# Altium footprint library Troposphere_lib.PcbLib: 48 footprints (part 3 of 3)
Each footprint in its own frame and in the unit in brackets; x right, y up, seen from the top. Pads: shape width x height; smd on the part's side, far side on the other; paste and mask are expansions set on the pad; w line width, h text height; cw(c..) or ccw(c..) is an arc to the next point about the centre after c.
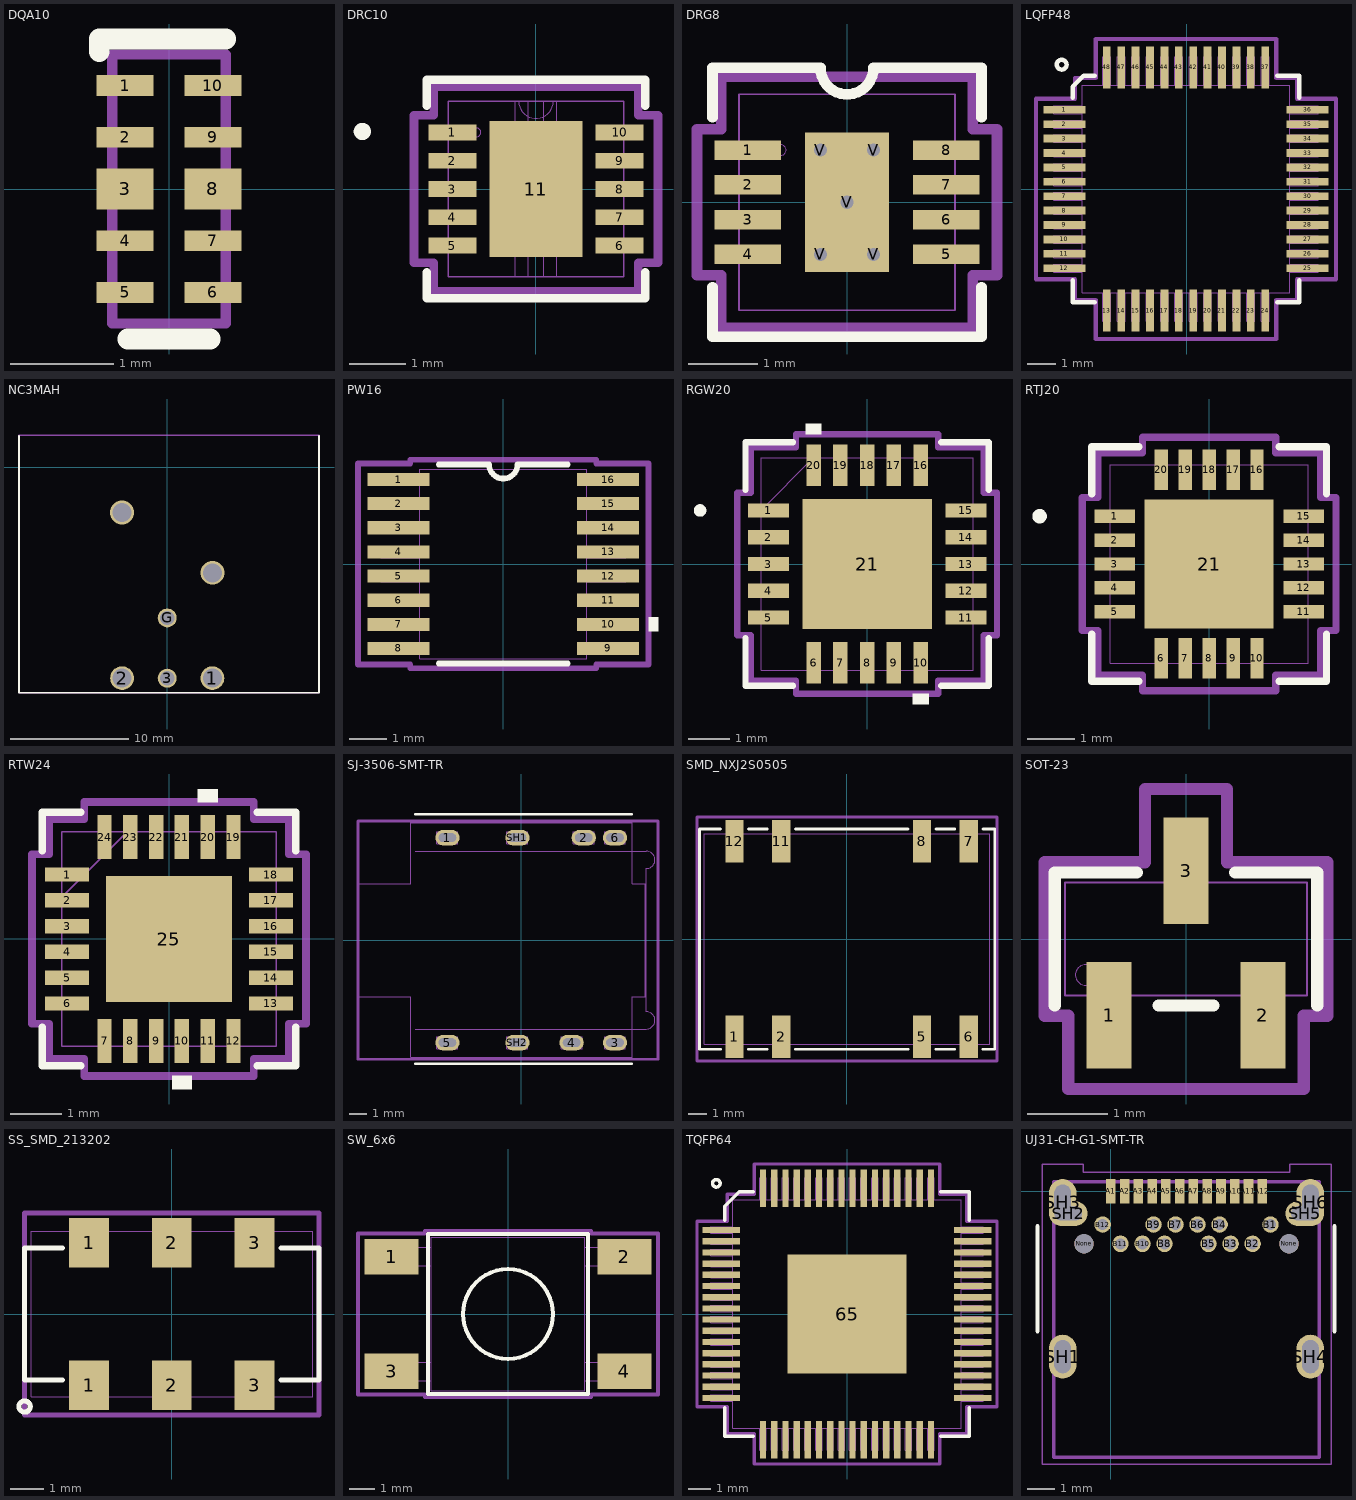
[diagram p2: the footprints below, top view; thin cyan lines are the x and y axes]

## DQA10 [mm]
pads (10):
  rect 0.55x0.2 smd paste+0 mask+0.051: 1(-0.425,1) 2(-0.425,0.5) 4(-0.425,-0.5) 5(-0.425,-1) 6(0.425,-1) 7(0.425,-0.5) 9(0.425,0.5) 10(0.425,1)
  rect 0.55x0.4 smd paste+0 mask+0.051: 3(-0.425,0) 8(0.425,0)
Top Overlay:
  lines w0.2: -0.675,1.33 -0.675,1.45 -0.55,1.45 0.55,1.45 ; -0.4,-1.45 0.4,-1.45
Mechanical 13:
  lines w0.1: -0.55,-1.3 0.55,-1.3 0.55,1.3 -0.55,1.3 -0.55,-1.3
3D body "DQA0010A.stp": height 0.55, standoff 0, extent -0.5,-1.25 0.5,1.25

## DRC10 [mm]
pads (11):
  rect 0.85x0.28 smd paste-0.14 mask+0: 1(-1.475,1) 2(-1.475,0.5) 3(-1.475,0) 4(-1.475,-0.5) 5(-1.475,-1) 6(1.475,-1) 7(1.475,-0.5) 8(1.475,0) 9(1.475,0.5) 10(1.475,1)
  rect 1.65x2.4 smd paste-0.825 mask+0: 11(0,0)
Top Overlay:
  circle w0.152: c-3.066,1.016 r0.076
  lines w0.152: -1.931,-1.471 -1.931,-1.931 1.931,-1.931 1.931,-1.471 ; -1.931,1.471 -1.931,1.931 1.931,1.931 1.931,1.471
Top Paste:
  region: 0.312,-1.251 0.184,-1.251 0.184,-1.499 0.312,-1.499
  region: -0.312,-1.251 -0.184,-1.251 -0.184,-1.499 -0.312,-1.499
  region: -0.312,1.251 -0.184,1.251 -0.184,1.499 -0.312,1.499
  region: 0.312,1.251 0.184,1.251 0.184,1.499 0.312,1.499
  region: 0.825,1.2 -0.825,1.2 -0.825,-1.2 0.825,-1.2
  region: 1.865,1.105 1.085,1.105 1.085,0.895 1.865,0.895
  region: 1.865,0.605 1.085,0.605 1.085,0.395 1.865,0.395
  region: 1.865,0.105 1.085,0.105 1.085,-0.105 1.865,-0.105
  region: 1.865,-0.395 1.085,-0.395 1.085,-0.605 1.865,-0.605
  region: 1.865,-0.895 1.085,-0.895 1.085,-1.105 1.865,-1.105
  region: -1.085,-0.895 -1.865,-0.895 -1.865,-1.105 -1.085,-1.105
  region: -1.085,-0.395 -1.865,-0.395 -1.865,-0.605 -1.085,-0.605
  region: -1.085,0.105 -1.865,0.105 -1.865,-0.105 -1.085,-0.105
  region: -1.085,0.605 -1.865,0.605 -1.865,0.395 -1.085,0.395
  region: -1.085,1.105 -1.865,1.105 -1.865,0.895 -1.085,0.895
Top Solder:
  region: 0.363,-1.2 0.133,-1.2 0.133,-1.55 0.363,-1.55
  region: -0.363,-1.2 -0.133,-1.2 -0.133,-1.55 -0.363,-1.55
  region: -0.363,1.2 -0.133,1.2 -0.133,1.55 -0.363,1.55
  region: 0.363,1.2 0.133,1.2 0.133,1.55 0.363,1.55
  region: 0,-1.2
  region: 0,1.2
  region: 1.935,1.175 1.015,1.175 1.015,0.825 1.935,0.825
  region: 1.935,0.675 1.015,0.675 1.015,0.325 1.935,0.325
  region: 1.935,0.175 1.015,0.175 1.015,-0.175 1.935,-0.175
  region: 1.935,-0.325 1.015,-0.325 1.015,-0.675 1.935,-0.675
  region: 1.935,-0.825 1.015,-0.825 1.015,-1.175 1.935,-1.175
  region: -1.015,-0.825 -1.935,-0.825 -1.935,-1.175 -1.015,-1.175
  region: -1.015,-0.325 -1.935,-0.325 -1.935,-0.675 -1.015,-0.675
  region: -1.015,0.175 -1.935,0.175 -1.935,-0.175 -1.015,-0.175
  region: -1.015,0.675 -1.935,0.675 -1.935,0.325 -1.015,0.325
  region: -1.015,1.175 -1.935,1.175 -1.935,0.825 -1.015,0.825
Mechanical 13:
  circle w0: c-1.05,1 r0.076
  region: 0,-1.2
  region: 0,1.2
  lines w0: -0.363,-1.2 -0.363,-1.55 -0.133,-1.55 -0.133,-1.2 ; -0.363,1.2 -0.363,1.55 -0.133,1.55 -0.133,1.2 ; -0.305,1.55 ccw(c0,1.55) 0.305,1.55 ; 0.133,-1.2 0.133,-1.55 0.363,-1.55 0.363,-1.2 ; 0.133,1.2 0.133,1.55 0.363,1.55 0.363,1.2
  lines w0.025: -1.55,-1.55 -1.55,1.55 1.55,1.55 1.55,-1.55 -1.55,-1.55
Mechanical 15:
  lines w0.152: -2.154,-1.301 -1.804,-1.301 -1.804,-1.804 1.804,-1.804 1.804,-1.301 2.154,-1.301 2.154,1.301 1.804,1.301 1.804,1.804 -1.804,1.804 -1.804,1.301 -2.154,1.301 -2.154,-1.301
3D body "DRC10_2P4X1P65.stp": height 1, standoff 0, extent -1.55,-1.55 1.55,1.55

## DRG8 [mm]
pads (14):
  rect 0.95x0.28 smd paste-0.14 mask+0: 1(-1.425,0.75) 2(-1.425,0.25) 3(-1.425,-0.25) 4(-1.425,-0.75) 5(1.425,-0.75) 6(1.425,-0.25) 7(1.425,0.25) 8(1.425,0.75)
  round 0.3 hole 0.188: V(-0.381,-0.75) V(-0.381,0.75) V(0,0) V(0.381,-0.75) V(0.381,0.75)
  rect 1.2x2 smd paste-0.987 mask-0.991: ""(0,0)
Top Layer:
  region: 0,-1
  region: 0,1
Top Overlay:
  lines w0.152: -1.931,-1.221 -1.931,-1.931 1.931,-1.931 1.931,-1.221 ; -1.931,1.221 -1.931,1.931 -0.381,1.931 ccw(c0,1.931) 0.381,1.931 1.931,1.931 1.931,1.221
Top Paste:
  region: 0.525,-0.494 0.241,-0.494 0.1,-0.635 0.1,-0.925 0.525,-0.925
  region: 0.525,0.294 0.241,0.294 0.1,0.152 0.1,-0.152 0.241,-0.294 0.525,-0.294
  region: 0.525,0.925 0.1,0.925 0.1,0.635 0.241,0.494 0.525,0.494
  region: -0.241,-0.494 -0.525,-0.494 -0.525,-0.925 -0.1,-0.925 -0.1,-0.635
  region: -0.241,0.294 -0.525,0.294 -0.525,-0.294 -0.241,-0.294 -0.1,-0.152 -0.1,0.152
  region: -0.1,0.925 -0.525,0.925 -0.525,0.494 -0.241,0.494 -0.1,0.635
  region: 1.875,0.865 0.975,0.865 0.975,0.635 1.875,0.635
  region: 1.875,0.365 0.975,0.365 0.975,0.135 1.875,0.135
  region: 1.875,-0.135 0.975,-0.135 0.975,-0.365 1.875,-0.365
  region: 1.875,-0.635 0.975,-0.635 0.975,-0.865 1.875,-0.865
  region: -0.975,-0.635 -1.875,-0.635 -1.875,-0.865 -0.975,-0.865
  region: -0.975,-0.135 -1.875,-0.135 -1.875,-0.365 -0.975,-0.365
  region: -0.975,0.365 -1.875,0.365 -1.875,0.135 -0.975,0.135
  region: -0.975,0.865 -1.875,0.865 -1.875,0.635 -0.975,0.635
Top Solder:
  region: 0,-1
  region: 0,1
  region: 0.2,-1.064 0.2,1.064 0.663,1.064 0.663,-1.064
  region: -0.663,-1.064 -0.663,1.064 -0.2,1.064 -0.2,-1.064
  region: -0.663,-1.064 -0.663,-0.594 0.663,-0.594 0.663,-1.064
  region: -0.663,-0.194 -0.663,0.194 0.663,0.194 0.663,-0.194
  region: -0.663,0.594 -0.663,1.064 0.663,1.064 0.663,0.594
  region: 1.97,0.96 0.88,0.96 0.88,0.54 1.97,0.54
  region: 1.97,0.46 0.88,0.46 0.88,0.04 1.97,0.04
  region: 1.97,-0.04 0.88,-0.04 0.88,-0.46 1.97,-0.46
  region: 1.97,-0.54 0.88,-0.54 0.88,-0.96 1.97,-0.96
  region: -0.88,-0.54 -1.97,-0.54 -1.97,-0.96 -0.88,-0.96
  region: -0.88,-0.04 -1.97,-0.04 -1.97,-0.46 -0.88,-0.46
  region: -0.88,0.46 -1.97,0.46 -1.97,0.04 -0.88,0.04
  region: -0.88,0.96 -1.97,0.96 -1.97,0.54 -0.88,0.54
Mechanical 13:
  circle w0: c-0.95,0.75 r0.076
  lines w0.025: -1.55,-1.55 -1.55,1.55 1.55,1.55 1.55,-1.55 -1.55,-1.55
Mechanical 15:
  lines w0.152: -2.154,-1.051 -1.804,-1.051 -1.804,-1.804 1.804,-1.804 1.804,-1.051 2.154,-1.051 2.154,1.051 1.804,1.051 1.804,1.804 -1.804,1.804 -1.804,1.051 -2.154,1.051 -2.154,-1.051
3D body "DRG8_1P2X2P0.stp": height 0.8, standoff 0, extent -1.55,-1.55 1.55,1.55

## LQFP48 [mm]
pads (48):
  rect 1.461x0.27 smd paste+0 mask+0: 1(-4.25,2.753) 2(-4.25,2.253) 3(-4.25,1.753) 4(-4.25,1.253) 5(-4.25,0.753) 6(-4.25,0.253) 7(-4.25,-0.247) 8(-4.25,-0.747) 9(-4.25,-1.247) 10(-4.25,-1.747) 11(-4.25,-2.247) 12(-4.25,-2.747) 25(4.2,-2.747) 26(4.2,-2.247) 27(4.2,-1.747) 28(4.2,-1.247) 29(4.2,-0.747) 30(4.2,-0.247) 31(4.2,0.253) 32(4.2,0.753) 33(4.2,1.253) 34(4.2,1.753) 35(4.2,2.253) 36(4.2,2.753)
  rect 0.27x1.461 smd paste+0 mask+0: 13(-2.775,-4.222) 14(-2.275,-4.222) 15(-1.775,-4.222) 16(-1.275,-4.222) 17(-0.775,-4.222) 18(-0.275,-4.222) 19(0.225,-4.222) 20(0.725,-4.222) 21(1.225,-4.222) 22(1.725,-4.222) 23(2.225,-4.222) 24(2.725,-4.222) 37(2.725,4.228) 38(2.225,4.228) 39(1.725,4.228) 40(1.225,4.228) 41(0.725,4.228) 42(0.225,4.228) 43(-0.275,4.228) 44(-0.775,4.228) 45(-1.275,4.228) 46(-1.775,4.228) 47(-2.275,4.228) 48(-2.775,4.228)
Top Overlay:
  circle w0.152: c-4.343,4.321 r0.17
  lines w0.152: -3.962,-3.172 -3.962,-3.934 -3.2,-3.934 ; -3.962,3.178 -3.962,3.559 -3.581,3.94 -3.2,3.94 ; 3.15,-3.934 3.912,-3.934 3.912,-3.172 ; 3.15,3.94 3.912,3.94 3.912,3.178
Mechanical 13:
  drawing of 196 lines, arcs and shapes, not listed
Mechanical 15:
  lines w0.152: -5.234,-3.136 -3.879,-3.136 -3.879,-3.851 -3.164,-3.851 -3.164,-5.207 3.114,-5.207 3.114,-3.851 3.829,-3.851 3.829,-3.136 5.185,-3.136 5.185,3.142 3.829,3.142 3.829,3.857 3.114,3.857 3.114,5.213 -3.164,5.213 -3.164,3.857 -3.879,3.857 -3.879,3.142 -5.234,3.142 -5.234,-3.136
3D body "LQFP-48.stp": height 1.6, standoff 0, extent -4.597,-4.597 4.597,4.597

## NC3MAH [mm]
pads (4):
  round 2 hole 1.6: 1(3.81,-17.78) 2(-3.81,-17.78)
  round 1.6 hole 1.2: 3(0,-17.78) G(0,-12.7)
via 3.81,-8.89 diameter 2 hole 1.6
via -3.81,-3.81 diameter 2 hole 1.6
Top Overlay:
  lines w0.152: -12.498,2.667 -12.498,-19 12.8,-19 12.8,2.667
Mechanical 13:
  circle w0.013: c-3.81,-3.81 r0.8
  circle w0.013: c0,-12.7 r0.6
  circle w0.013: c-3.81,-17.78 r0.8
  circle w0.013: c3.81,-8.89 r0.8
  circle w0.013: c0,-17.78 r0.6
  circle w0.013: c3.81,-17.78 r0.8
  lines w0.025: -12.498,-19 -12.498,2.7 12.8,2.7 12.8,-19 -12.498,-19
Mechanical 15:
  lines w0.152: -12.498,-19 -12.498,2.7 12.8,2.7 12.8,-19 -12.498,-19
3D body "Neutrik NC3MAH-0.STEP": height 25.3, standoff -3.5, extent -12.498,-19 12.8,2.7

## PW16 [mil]
pads (16):
  rect 66x14 smd paste+0 mask+0: 1(-111,89.57) 2(-111,63.98) 3(-111,38.39) 4(-111,12.8) 5(-111,-12.8) 6(-111,-38.39) 7(-111,-63.98) 8(-111,-89.57) 9(111,-89.57) 10(111,-63.98) 11(111,-38.39) 12(111,-12.8) 13(111,12.8) 14(111,38.39) 15(111,63.98) 16(111,89.57)
Top Overlay:
  region: 154,-56.48 164,-56.48 164,-71.48 154,-71.48
  lines w6: -68.42,-105.5 68.42,-105.5 ; -68.42,105.5 -15,105.5 ccw(c0,105.5) 15,105.5 68.42,105.5
Mechanical 13:
  lines w0: -12,100.5 ccw(c0,100.5) 12,100.5
  lines w1: -130,-95.57 -130,-83.57 -88.5,-83.57 -88.5,-95.57 -130,-95.57 ; -130,-69.98 -130,-57.98 -88.5,-57.98 -88.5,-69.98 -130,-69.98 ; -130,-44.39 -130,-32.39 -88.5,-32.39 -88.5,-44.39 -130,-44.39 ; -130,-18.8 -130,-6.8 -88.5,-6.8 -88.5,-18.8 -130,-18.8 ; -130,6.8 -130,18.8 -88.5,18.8 -88.5,6.8 -130,6.8 ; -130,32.39 -130,44.39 -88.5,44.39 -88.5,32.39 -130,32.39 ; -130,57.98 -130,69.98 -88.5,69.98 -88.5,57.98 -130,57.98 ; -130,83.57 -130,95.57 -88.5,95.57 -88.5,83.57 -130,83.57 ; -88.5,-100.5 88.5,-100.5 88.5,100.5 -88.5,100.5 -88.5,-100.5 ; 88.5,-95.57 88.5,-83.57 130,-83.57 130,-95.57 88.5,-95.57 ; 88.5,-69.98 88.5,-57.98 130,-57.98 130,-69.98 88.5,-69.98 ; 88.5,-44.39 88.5,-32.39 130,-32.39 130,-44.39 88.5,-44.39 ; 88.5,-18.8 88.5,-6.8 130,-6.8 130,-18.8 88.5,-18.8 ; 88.5,6.8 88.5,18.8 130,18.8 130,6.8 88.5,6.8 ; 88.5,32.39 88.5,44.39 130,44.39 130,32.39 88.5,32.39 ; 88.5,57.98 88.5,69.98 130,69.98 130,57.98 88.5,57.98 ; 88.5,83.57 88.5,95.57 130,95.57 130,83.57 88.5,83.57
Mechanical 15:
  lines w6: -154,-106.57 -154,106.57 -98.5,106.57 -98.5,110.5 98.5,110.5 98.5,106.57 154,106.57 154,-106.57 98.5,-106.57 98.5,-110.5 -98.5,-110.5 -98.5,-106.57 -154,-106.57
3D body "PW16.stp": height 47.09, standoff 0, extent -129.99,-100.5 130.01,100.52

## RGW20 [mm]
pads (21):
  rect 1x0.35 smd paste-0.175 mask+0: 1(-2.4,1.3) 2(-2.4,0.65) 3(-2.4,0) 4(-2.4,-0.65) 5(-2.4,-1.3) 11(2.4,-1.3) 12(2.4,-0.65) 13(2.4,0) 14(2.4,0.65) 15(2.4,1.3)
  rect 0.35x1 smd paste-0.175 mask+0: 6(-1.3,-2.4) 7(-0.65,-2.4) 8(0,-2.4) 9(0.65,-2.4) 10(1.3,-2.4) 16(1.3,2.4) 17(0.65,2.4) 18(0,2.4) 19(-0.65,2.4) 20(-1.3,2.4)
  rect 3.15x3.15 smd paste-1.562 mask-1.562: 21(0,0)
Top Overlay:
  circle w0.152: c-4.056,1.3 r0.076
  region: -1.109,3.154 -1.49,3.154 -1.49,3.408 -1.109,3.408
  region: 1.49,-3.154 1.109,-3.154 1.109,-3.408 1.49,-3.408
  lines w0.152: -2.956,-1.803 -2.956,-2.956 -1.803,-2.956 ; -2.956,1.803 -2.956,2.956 -1.803,2.956 ; 1.803,-2.956 2.956,-2.956 2.956,-1.803 ; 1.803,2.956 2.956,2.956 2.956,1.803
Top Paste:
  drawing of 45 lines, arcs and shapes, not listed
Top Solder:
  region: 1.381,-1.639 1.381,1.639 1.639,1.639 1.639,-1.639
  region: 0.981,-1.639 0.981,1.639 0.594,1.639 0.594,-1.639
  region: 0.194,-1.639 0.194,1.639 -0.194,1.639 -0.194,-1.639
  region: -0.594,-1.639 -0.594,1.639 -0.981,1.639 -0.981,-1.639
  region: -1.639,-1.639 -1.639,1.639 -1.381,1.639 -1.381,-1.639
  region: -1.639,-1.639 -1.639,-1.381 1.639,-1.381 1.639,-1.639
  region: -1.639,-0.981 -1.639,-0.594 1.639,-0.594 1.639,-0.981
  region: -1.639,-0.194 -1.639,0.194 1.639,0.194 1.639,-0.194
  region: -1.639,0.594 -1.639,0.981 1.639,0.981 1.639,0.594
  region: -1.639,1.381 -1.639,1.639 1.639,1.639 1.639,1.381
  region: -1.055,2.97 -1.545,2.97 -1.545,1.83 -1.055,1.83
  region: -0.405,2.97 -0.895,2.97 -0.895,1.83 -0.405,1.83
  region: 0.245,2.97 -0.245,2.97 -0.245,1.83 0.245,1.83
  region: 0.895,2.97 0.405,2.97 0.405,1.83 0.895,1.83
  region: 1.545,2.97 1.055,2.97 1.055,1.83 1.545,1.83
  region: 2.97,1.545 1.83,1.545 1.83,1.055 2.97,1.055
  region: 2.97,0.895 1.83,0.895 1.83,0.405 2.97,0.405
  region: 2.97,0.245 1.83,0.245 1.83,-0.245 2.97,-0.245
  region: 2.97,-0.405 1.83,-0.405 1.83,-0.895 2.97,-0.895
  region: 2.97,-1.055 1.83,-1.055 1.83,-1.545 2.97,-1.545
  region: 1.545,-1.83 1.055,-1.83 1.055,-2.97 1.545,-2.97
  region: 0.895,-1.83 0.405,-1.83 0.405,-2.97 0.895,-2.97
  region: 0.245,-1.83 -0.245,-1.83 -0.245,-2.97 0.245,-2.97
  region: -0.405,-1.83 -0.895,-1.83 -0.895,-2.97 -0.405,-2.97
  region: -1.055,-1.83 -1.545,-1.83 -1.545,-2.97 -1.055,-2.97
  region: -1.83,-1.055 -2.97,-1.055 -2.97,-1.545 -1.83,-1.545
  region: -1.83,-0.405 -2.97,-0.405 -2.97,-0.895 -1.83,-0.895
  region: -1.83,0.245 -2.97,0.245 -2.97,-0.245 -1.83,-0.245
  region: -1.83,0.895 -2.97,0.895 -2.97,0.405 -1.83,0.405
  region: -1.83,1.545 -2.97,1.545 -2.97,1.055 -1.83,1.055
Mechanical 13:
  lines w0.025: -2.575,1.305 -1.305,2.575 ; -2.575,-2.575 -2.575,2.575 2.575,2.575 2.575,-2.575 -2.575,-2.575
Mechanical 15:
  lines w0.152: -3.154,-1.729 -3.154,1.729 -2.829,1.729 -2.829,2.829 -1.729,2.829 -1.729,3.154 1.729,3.154 1.729,2.829 2.829,2.829 2.829,1.729 3.154,1.729 3.154,-1.729 2.829,-1.729 2.829,-2.829 1.729,-2.829 1.729,-3.154 -1.729,-3.154 -1.729,-2.829 -2.829,-2.829 -2.829,-1.729 -3.154,-1.729
3D body "RGW20_3P15X3P15.step": height 1, standoff 0, extent -2.626,-2.626 2.626,2.626

## RTJ20 [mm]
pads (21):
  rect 0.85x0.28 smd paste-0.14 mask+0: 1(-1.975,1) 2(-1.975,0.5) 3(-1.975,0) 4(-1.975,-0.5) 5(-1.975,-1) 11(1.975,-1) 12(1.975,-0.5) 13(1.975,0) 14(1.975,0.5) 15(1.975,1)
  rect 0.28x0.85 smd paste-0.14 mask+0: 6(-1,-1.975) 7(-0.5,-1.975) 8(0,-1.975) 9(0.5,-1.975) 10(1,-1.975) 16(1,1.975) 17(0.5,1.975) 18(0,1.975) 19(-0.5,1.975) 20(-1,1.975)
  rect 2.7x2.7 smd paste-1.337 mask-1.333: 21(0,0)
Top Overlay:
  circle w0.152: c-3.548,1 r0.076
  lines w0.152: -2.456,-1.468 -2.456,-2.456 -1.468,-2.456 ; -2.456,1.468 -2.456,2.456 -1.468,2.456 ; 1.468,-2.456 2.456,-2.456 2.456,-1.468 ; 1.468,2.456 2.456,2.456 2.456,1.468
Top Paste:
  drawing of 36 lines, arcs and shapes, not listed
Top Solder:
  region: 0.987,-1.413 0.987,1.413 1.413,1.413 1.413,-1.413
  region: 0.587,-1.413 0.587,1.413 0.2,1.413 0.2,-1.413
  region: -0.2,-1.413 -0.2,1.413 -0.587,1.413 -0.587,-1.413
  region: -1.413,-1.413 -1.413,1.413 -0.987,1.413 -0.987,-1.413
  region: -1.413,-1.413 -1.413,-0.987 1.413,-0.987 1.413,-1.413
  region: -1.413,-0.587 -1.413,-0.2 1.413,-0.2 1.413,-0.587
  region: -1.413,0.2 -1.413,0.587 1.413,0.587 1.413,0.2
  region: -1.413,0.987 -1.413,1.413 1.413,1.413 1.413,0.987
  region: -0.81,2.45 -1.19,2.45 -1.19,1.5 -0.81,1.5
  region: -0.31,2.45 -0.69,2.45 -0.69,1.5 -0.31,1.5
  region: 0.19,2.45 -0.19,2.45 -0.19,1.5 0.19,1.5
  region: 0.69,2.45 0.31,2.45 0.31,1.5 0.69,1.5
  region: 1.19,2.45 0.81,2.45 0.81,1.5 1.19,1.5
  region: 2.45,1.19 1.5,1.19 1.5,0.81 2.45,0.81
  region: 2.45,0.69 1.5,0.69 1.5,0.31 2.45,0.31
  region: 2.45,0.19 1.5,0.19 1.5,-0.19 2.45,-0.19
  region: 2.45,-0.31 1.5,-0.31 1.5,-0.69 2.45,-0.69
  region: 2.45,-0.81 1.5,-0.81 1.5,-1.19 2.45,-1.19
  region: 1.19,-1.5 0.81,-1.5 0.81,-2.45 1.19,-2.45
  region: 0.69,-1.5 0.31,-1.5 0.31,-2.45 0.69,-2.45
  region: 0.19,-1.5 -0.19,-1.5 -0.19,-2.45 0.19,-2.45
  region: -0.31,-1.5 -0.69,-1.5 -0.69,-2.45 -0.31,-2.45
  region: -0.81,-1.5 -1.19,-1.5 -1.19,-2.45 -0.81,-2.45
  region: -1.5,-0.81 -2.45,-0.81 -2.45,-1.19 -1.5,-1.19
  region: -1.5,-0.31 -2.45,-0.31 -2.45,-0.69 -1.5,-0.69
  region: -1.5,0.19 -2.45,0.19 -2.45,-0.19 -1.5,-0.19
  region: -1.5,0.69 -2.45,0.69 -2.45,0.31 -1.5,0.31
  region: -1.5,1.19 -2.45,1.19 -2.45,0.81 -1.5,0.81
Mechanical 13:
  lines w0.025: -2.075,-2.075 -2.075,2.075 2.075,2.075 2.075,-2.075 -2.075,-2.075
Mechanical 15:
  lines w0.152: -2.654,-1.394 -2.654,1.394 -2.329,1.394 -2.329,2.329 -1.394,2.329 -1.394,2.654 1.394,2.654 1.394,2.329 2.329,2.329 2.329,1.394 2.654,1.394 2.654,-1.394 2.329,-1.394 2.329,-2.329 1.394,-2.329 1.394,-2.654 -1.394,-2.654 -1.394,-2.329 -2.329,-2.329 -2.329,-1.394 -2.654,-1.394
Mechanical 16:
  circle w0.127: c0.787,0.787 r0.191
  circle w0.127: c0.787,0 r0.191
  circle w0.127: c0.787,-0.787 r0.191
  circle w0.127: c0,0.787 r0.191
  circle w0.127: c0,0 r0.191
  circle w0.127: c0,-0.787 r0.191
  circle w0.127: c-0.787,0.787 r0.191
  circle w0.127: c-0.787,0 r0.191
  circle w0.127: c-0.787,-0.787 r0.191
3D body "RTJ20_2P7X2P7.stp": height 0.8, standoff 0, extent -2.126,-2.126 2.126,2.126

## RTW24 [mm]
pads (25):
  rect 0.85x0.28 smd paste-0.14 mask+0: 1(-1.975,1.25) 2(-1.975,0.75) 3(-1.975,0.25) 4(-1.975,-0.25) 5(-1.975,-0.75) 6(-1.975,-1.25) 13(1.975,-1.25) 14(1.975,-0.75) 15(1.975,-0.25) 16(1.975,0.25) 17(1.975,0.75) 18(1.975,1.25)
  rect 0.28x0.85 smd paste-0.14 mask+0: 7(-1.25,-1.975) 8(-0.75,-1.975) 9(-0.25,-1.975) 10(0.25,-1.975) 11(0.75,-1.975) 12(1.25,-1.975) 19(1.25,1.975) 20(0.75,1.975) 21(0.25,1.975) 22(-0.25,1.975) 23(-0.75,1.975) 24(-1.25,1.975)
  rect 2.45x2.45 smd paste-1.212 mask-1.206: 25(0,0)
Top Overlay:
  region: 0.44,-2.654 0.059,-2.654 0.059,-2.908 0.44,-2.908
  region: 0.941,2.654 0.56,2.654 0.56,2.908 0.941,2.908
  lines w0.152: -2.456,-1.718 -2.456,-2.456 -1.718,-2.456 ; -2.456,1.718 -2.456,2.456 -1.718,2.456 ; 1.718,-2.456 2.456,-2.456 2.456,-1.718 ; 1.718,2.456 2.456,2.456 2.456,1.718
Top Paste:
  drawing of 40 lines, arcs and shapes, not listed
Top Solder:
  region: -1.48,1.46 -2.47,1.46 -2.47,1.04 -1.48,1.04
  region: -1.48,0.96 -2.47,0.96 -2.47,0.54 -1.48,0.54
  region: -1.48,0.46 -2.47,0.46 -2.47,0.04 -1.48,0.04
  region: -1.48,-0.04 -2.47,-0.04 -2.47,-0.46 -1.48,-0.46
  region: -1.48,-0.54 -2.47,-0.54 -2.47,-0.96 -1.48,-0.96
  region: -1.48,-1.04 -2.47,-1.04 -2.47,-1.46 -1.48,-1.46
  region: -1.04,-1.48 -1.46,-1.48 -1.46,-2.47 -1.04,-2.47
  region: -0.54,-1.48 -0.96,-1.48 -0.96,-2.47 -0.54,-2.47
  region: -0.04,-1.48 -0.46,-1.48 -0.46,-2.47 -0.04,-2.47
  region: 0.46,-1.48 0.04,-1.48 0.04,-2.47 0.46,-2.47
  region: 0.96,-1.48 0.54,-1.48 0.54,-2.47 0.96,-2.47
  region: 1.46,-1.48 1.04,-1.48 1.04,-2.47 1.46,-2.47
  region: 2.47,-1.04 1.48,-1.04 1.48,-1.46 2.47,-1.46
  region: 2.47,-0.54 1.48,-0.54 1.48,-0.96 2.47,-0.96
  region: 2.47,-0.04 1.48,-0.04 1.48,-0.46 2.47,-0.46
  region: 2.47,0.46 1.48,0.46 1.48,0.04 2.47,0.04
  region: 2.47,0.96 1.48,0.96 1.48,0.54 2.47,0.54
  region: 2.47,1.46 1.48,1.46 1.48,1.04 2.47,1.04
  region: 1.46,2.47 1.04,2.47 1.04,1.48 1.46,1.48
  region: 0.96,2.47 0.54,2.47 0.54,1.48 0.96,1.48
  region: 0.46,2.47 0.04,2.47 0.04,1.48 0.46,1.48
  region: -0.04,2.47 -0.46,2.47 -0.46,1.48 -0.04,1.48
  region: -0.54,2.47 -0.96,2.47 -0.96,1.48 -0.54,1.48
  region: -1.04,2.47 -1.46,2.47 -1.46,1.48 -1.04,1.48
  region: -1.289,0.987 -1.289,1.288 1.288,1.288 1.288,0.987
  region: -1.289,0.2 -1.289,0.587 1.288,0.587 1.288,0.2
  region: -1.289,-0.587 -1.289,-0.2 1.288,-0.2 1.288,-0.587
  region: -1.289,-1.289 -1.289,-0.987 1.288,-0.987 1.288,-1.289
  region: -1.289,-1.289 -1.289,1.288 -0.987,1.288 -0.987,-1.289
  region: -0.2,-1.289 -0.2,1.288 -0.587,1.288 -0.587,-1.289
  region: 0.587,-1.289 0.587,1.288 0.2,1.288 0.2,-1.289
  region: 0.987,-1.289 0.987,1.288 1.288,1.288 1.288,-1.289
Mechanical 13:
  lines w0.025: -2.075,0.805 -0.805,2.075 ; -2.075,-2.075 2.075,-2.075 2.075,2.075 -2.075,2.075 -2.075,-2.075
Mechanical 15:
  lines w0.152: -2.654,-1.644 -2.329,-1.644 -2.329,-2.329 -1.644,-2.329 -1.644,-2.654 1.644,-2.654 1.644,-2.329 2.329,-2.329 2.329,-1.644 2.654,-1.644 2.654,1.644 2.329,1.644 2.329,2.329 1.644,2.329 1.644,2.654 -1.644,2.654 -1.644,2.329 -2.329,2.329 -2.329,1.644 -2.654,1.644 -2.654,-1.644
Mechanical 16:
  circle w0.127: c-0.787,-0.787 r0.191
  circle w0.127: c-0.787,0 r0.191
  circle w0.127: c-0.787,0.787 r0.191
  circle w0.127: c0,-0.787 r0.191
  circle w0.127: c0,0 r0.191
  circle w0.127: c0,0.787 r0.191
  circle w0.127: c0.787,-0.787 r0.191
  circle w0.127: c0.787,0 r0.191
  circle w0.127: c0.787,0.787 r0.191
3D body "RTW24_2P45X2P45.stp": height 0.74, standoff 0, extent -2.126,-2.126 2.126,2.126

## SJ-3506-SMT-TR [mm]
pads (8):
  oval 1.4x0.9 hole 0.5 slot 1 at 0 deg: 1(-4.25,5.9) 2(3.6,5.9) 3(5.4,-5.9) 4(2.9,-5.9) 5(-4.25,-5.9) 6(5.4,5.9) SH1(-0.22,5.9) SH2(-0.22,-5.9)
Top Overlay:
  lines w0.152: -6.096,-7.112 6.35,-7.112 ; -6.096,7.239 6.35,7.239
Mechanical 13:
  lines w0.025: -6.1,-5.125 7.2,-5.125 ; -6.1,5.125 7.2,5.125 ; 7.196,-5.125 ccw(c7.187,-4.613) 7.7,-4.604 ccw(c7.213,-4.613) 7.204,-4.125 ; 7.196,5.125 cw(c7.187,4.613) 7.7,4.604 cw(c7.213,4.613) 7.204,4.125 ; 7.2,-4.125 7.2,4.125 ; -4.85,-6.25 -4.85,-5.55 -3.65,-5.55 -3.65,-6.25 -4.85,-6.25 ; -4.85,5.55 -4.85,6.25 -3.65,6.25 -3.65,5.55 -4.85,5.55 ; -0.82,-6.25 -0.82,-5.55 0.38,-5.55 0.38,-6.25 -0.82,-6.25 ; -0.82,5.55 -0.82,6.25 0.38,6.25 0.38,5.55 -0.82,5.55 ; 2.3,-6.25 2.3,-5.55 3.5,-5.55 3.5,-6.25 2.3,-6.25 ; 3,5.55 4.2,5.55 4.2,6.25 3,6.25 3,5.55 ; 4.8,-6.25 4.8,-5.55 6,-5.55 6,-6.25 4.8,-6.25 ; 4.8,5.55 4.8,6.25 6,6.25 6,5.55 4.8,5.55
  lines w0.05: -9.35,-3.25 -9.35,3.25 -6.35,3.25 -6.35,6.75 6.4,6.75 6.4,3.25 7.15,3.25 7.15,-3.25 6.4,-3.25 6.4,-6.75 -6.35,-6.75 -6.35,-3.25 -9.35,-3.25
Mechanical 15:
  lines w0.152: -9.398,-6.858 -6.35,-6.858 7.874,-6.858 7.874,6.858 -9.398,6.858 -9.398,-6.858
3D body "CUI_SJ-3506-SMT-TR.step": height 3.25, standoff -2.75, extent -8.8,-6.4 6.6,6.4

## SMD_NXJ2S0505 [mm]
pads (8):
  rect 1x2.3 smd mask+0: 1(-6.097,-5.3) 2(-3.557,-5.3) 5(4.063,-5.3) 6(6.603,-5.3) 7(6.603,5.3) 8(4.063,5.3) 11(-3.557,5.3) 12(-6.097,5.3)
Top Overlay:
  lines w0.152: -6.858,-5.969 -8.001,-5.969 -8.001,5.969 -6.858,5.969 ; -5.334,-5.969 -4.318,-5.969 ; -5.334,5.969 -4.318,5.969 ; -2.794,-5.969 3.302,-5.969 ; -2.794,5.969 3.302,5.969 ; 4.826,-5.969 5.842,-5.969 ; 4.826,5.969 5.842,5.969 ; 7.366,-5.969 8.001,-5.969 8.001,5.969 7.366,5.969
Mechanical 13:
  lines w0.025: -7.747,-5.715 -7.747,5.715 7.747,5.715 7.747,-5.715 -7.747,-5.715
Mechanical 15:
  lines w0.152: -8.128,-6.604 -6.604,-6.604 8.128,-6.604 8.128,6.604 -8.128,6.604 -8.128,-6.604
3D body "mps_dcdc_nxj2_5v_12v_mc_a.step": height 4.39, standoff -0.02, extent -7.747,-5.715 7.747,5.715

## SOT-23 [mil]
pads (3):
  rect 22x52 smd paste+0 mask+0: 1(-37.5,-37.21) 2(37.5,-37.21) 3(0,33.36)
Top Overlay:
  lines w6: -64,-32.5 -64,32.5 -24.1,32.5 ; -13.4,-32.5 13.4,-32.5 ; 24.1,32.5 64,32.5 64,-32.5
Mechanical 13:
  circle w0: c-49,-17.5 r5
  lines w1: -59,-27.5 59,-27.5 59,27.5 -59,27.5 -59,-27.5 ; -47.5,-49.21 -47.5,-27.5 -27.5,-27.5 -27.5,-49.21 -47.5,-49.21 ; -10,27.5 10,27.5 10,49.21 -10,49.21 -10,27.5 ; 27.5,-49.21 27.5,-27.5 47.5,-27.5 47.5,-49.21 27.5,-49.21
Mechanical 15:
  lines w6: -69,-37.5 -69,37.5 -20,37.5 -20,73.21 20,73.21 20,37.5 69,37.5 69,-37.5 57.5,-37.5 57.5,-73.21 -57.5,-73.21 -57.5,-37.5 -69,-37.5
3D body "SOT-23.stp": height 39.37, standoff 0, extent -59.05,-50 59.05,50.39

## SS_SMD_213202 [mm]
pads (6):
  rect 1.2x1.5 smd mask+0: 1(-2.5,-2.15) 1(-2.5,2.15) 2(0,-2.15) 2(0,2.15) 3(2.5,-2.15) 3(2.5,2.15)
Top Overlay:
  circle w0.152: c-4.445,-2.794 r0.17
  lines w0.152: -3.302,-2 -4.445,-2 -4.445,2 -3.302,2 ; 3.302,-2 4.445,-2 4.445,2 3.302,2
Mechanical 13:
  lines w0.025: -4.25,-2.496 4.25,-2.496 4.25,2.504 -4.25,2.504 -4.25,-2.496
Mechanical 15:
  lines w0.152: -4.445,-3.048 -2.921,-3.048 4.445,-3.048 4.445,3.048 -4.445,3.048 -4.445,-3.048
3D body "SSSS213202.STEP": height 5.8, standoff 0, extent -4.25,-2.496 4.25,2.504

## SW_6x6 [mil]
pads (4):
  rect 83x55 smd paste+0 mask+0: 1(-179,88) 2(179,88) 3(-179,-88) 4(179,-88)
Top Overlay:
  circle w6: c0,0 r69
  lines w6: -123,-123 123,-123 123,123 -123,123 -123,-123
Mechanical 13:
  circle w0: c0,0 r69
  lines w1: -197,-102.5 -197,-74.5 -118,-74.5 -118,-102.5 -197,-102.5 ; -197,74.5 -197,102.5 -118,102.5 -118,74.5 -197,74.5 ; -118,-118 118,-118 118,118 -118,118 -118,-118 ; 118,-102.5 118,-74.5 197,-74.5 197,-102.5 118,-102.5 ; 118,74.5 118,102.5 197,102.5 197,74.5 118,74.5
Mechanical 15:
  lines w6: -230.5,-123.5 -128,-123.5 -128,-128 128,-128 128,-123.5 230.5,-123.5 230.5,123.5 128,123.5 128,128 -128,128 -128,123.5 -230.5,123.5 -230.5,-123.5
3D body "Tactal Switch - SMD (6mmx 6mmx 4.3mm) - Marked.stp": height 169.29, standoff 0, extent -177.49,-118.74 177.51,118.76

## TQFP64 [mil]
pads (65):
  rect 65.5x11 smd paste+0 mask+0: 1(-221.25,147.64) 2(-221.25,127.95) 3(-221.25,108.27) 4(-221.25,88.58) 5(-221.25,68.9) 6(-221.25,49.21) 7(-221.25,29.53) 8(-221.25,9.84) 9(-221.25,-9.84) 10(-221.25,-29.53) 11(-221.25,-49.21) 12(-221.25,-68.9) 13(-221.25,-88.58) 14(-221.25,-108.27) 15(-221.25,-127.95) 16(-221.25,-147.64) 33(221.25,-147.64) 34(221.25,-127.95) 35(221.25,-108.27) 36(221.25,-88.58) 37(221.25,-68.9) 38(221.25,-49.21) 39(221.25,-29.53) 40(221.25,-9.84) 41(221.25,9.84) 42(221.25,29.53) 43(221.25,49.21) 44(221.25,68.9) 45(221.25,88.58) 46(221.25,108.27) 47(221.25,127.95) 48(221.25,147.64)
  rect 11x65.5 smd paste+0 mask+0: 17(-147.64,-221.25) 18(-127.95,-221.25) 19(-108.27,-221.25) 20(-88.58,-221.25) 21(-68.9,-221.25) 22(-49.21,-221.25) 23(-29.53,-221.25) 24(-9.84,-221.25) 25(9.84,-221.25) 26(29.53,-221.25) 27(49.21,-221.25) 28(68.9,-221.25) 29(88.58,-221.25) 30(108.27,-221.25) 31(127.95,-221.25) 32(147.64,-221.25) 49(147.64,221.25) 50(127.95,221.25) 51(108.27,221.25) 52(88.58,221.25) 53(68.9,221.25) 54(49.21,221.25) 55(29.53,221.25) 56(9.84,221.25) 57(-9.84,221.25) 58(-29.53,221.25) 59(-49.21,221.25) 60(-68.9,221.25) 61(-88.58,221.25) 62(-108.27,221.25) 63(-127.95,221.25) 64(-147.64,221.25)
  rect 208.66x208.66 smd mask+0: 65(0,0)
Top Overlay:
  circle w6: c-230,230 r6.69
  lines w6: -215,-165 -215,-215 -165,-215 ; -215,165 -215,190 -190,215 -165,215 ; 165,-215 215,-215 215,-165 ; 165,215 215,215 215,165
Mechanical 13:
  drawing of 260 lines, arcs and shapes, not listed
Mechanical 15:
  lines w6: -264,-163.14 -211,-163.14 -211,-211 -163.14,-211 -163.14,-264 163.14,-264 163.14,-211 211,-211 211,-163.14 264,-163.14 264,163.14 211,163.14 211,211 163.14,211 163.14,264 -163.14,264 -163.14,211 -211,211 -211,163.14 -264,163.14 -264,-163.14
3D body "TQFP64.stp": height 47.09, standoff 0, extent -239.99,-239.99 240.01,240.01

## UJ31-CH-G1-SMT-TR [mm]
pads (32):
  rect 0.35x0.89 smd: A1(0,0) A2(0.5,0) A3(1,0) A4(1.5,0) A5(2,0) A6(2.5,0) A7(3,0) A8(3.5,0) A9(4,0) A10(4.5,0) A11(5,0) A12(5.5,0)
  round 0.6 hole 0.4: B1(5.8,-1.205) B2(5.15,-1.905) B3(4.35,-1.905) B4(3.95,-1.205) B5(3.55,-1.905) B6(3.15,-1.205) B7(2.35,-1.205) B8(1.95,-1.905) B9(1.55,-1.205) B10(1.15,-1.905) B11(0.35,-1.905) B12(-0.3,-1.205)
  round 0.7 hole 0.7 unplated: None(-0.975,-1.905) None(6.475,-1.905)
  oval 1x1.6 hole 0.6 slot 1.2 at 90 deg: SH1(-1.75,-6.005) SH4(7.25,-6.005)
  oval 1.4x0.9 hole 0.5 slot 1 at 0 deg: SH2(-1.55,-0.805) SH5(7.05,-0.805)
  oval 1x1.7 hole 0.6 slot 1.3 at 90 deg: SH3(-1.75,-0.4) SH6(7.25,-0.4)
Top Overlay:
  lines w0.152: -2.667,-5.08 -2.667,-1.27 ; 8.128,-5.08 8.128,-1.27
Mechanical 4:
  lines w0: -2.05,-6.455 ccw(c-1.75,-6.455) -1.45,-6.455 ; -2.05,-5.555 cw(c-1.75,-5.555) -1.45,-5.555 ; -2.05,-0.804 ccw(c-1.775,-0.78) -1.751,-1.055 ; -2.05,-0.055 cw(c-1.75,-0.055) -1.45,-0.055 ; -1.3,-1.055 ccw(c-1.3,-0.805) -1.3,-0.555 ; 6.8,-1.055 cw(c6.8,-0.805) 6.8,-0.555 ; 6.95,-6.455 ccw(c7.25,-6.455) 7.55,-6.455 ; 6.95,-5.555 cw(c7.25,-5.555) 7.55,-5.555 ; 6.95,-0.055 cw(c7.25,-0.055) 7.55,-0.055 ; 7.251,-1.055 ccw(c7.275,-0.78) 7.55,-0.804
Mechanical 13:
  lines w0.127: -2.075,-9.655 7.575,-9.655 7.575,0.345 -2.075,0.345 -2.075,-9.655
Mechanical 15:
  lines w0: -2.05,-6.455 -2.05,-5.555 ; -2.05,-0.805 -2.05,-0.055 ; -1.75,-1.055 -1.3,-1.055 ; -1.45,-6.455 -1.45,-5.555 ; -1.45,-0.055 -1.45,-0.555 -1.3,-0.555 ; 6.8,-1.055 7.25,-1.055 ; 6.8,-0.555 6.95,-0.555 6.95,-0.055 ; 6.95,-6.455 6.95,-5.555 ; 7.55,-6.455 7.55,-5.555 ; 7.55,-0.805 7.55,-0.055
  lines w0.05: -2.5,-9.905 -2.5,0.995 -1,0.995 -1,0.695 6.5,0.695 6.5,0.995 8,0.995 8,-9.905 -2.5,-9.905
3D body "CUI_UJ31-CH-G1-SMT-TR.step": height 3.5, standoff -0.96, extent -2.2,-9.65 7.7,0.35